# Altium schematic symbol library Kondensator_DIP.SchLib: 1521 symbols (part 1 of 4) (continued)
## K50-6-220U-6.3V-0812 (continued)
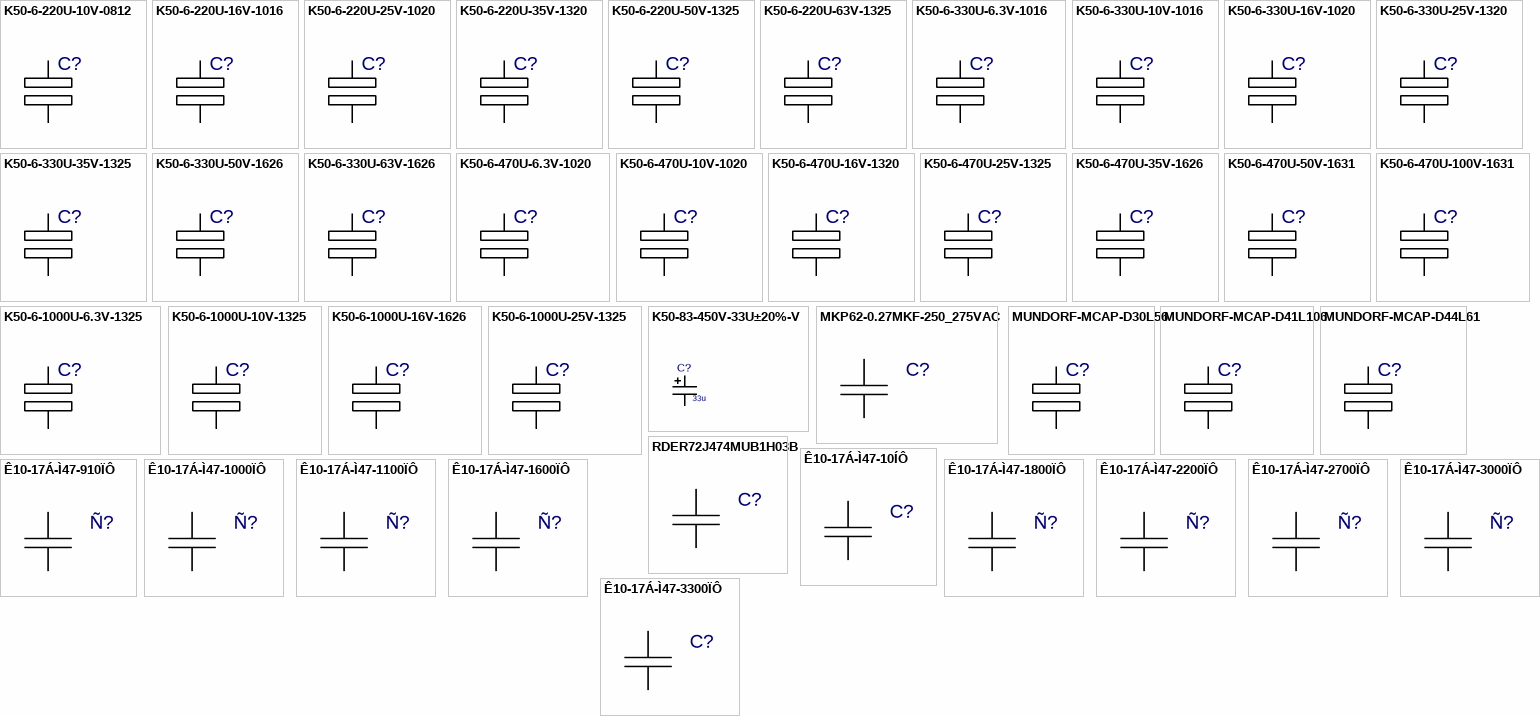
[diagram p7: symbols K50-6-220U-10V-0812 to Ê10-17Á-Ì47-3300ÏÔ]

## K50-6-220U-10V-0812
designator C?  (value not drawn)
Author: pcbdesigner.ru; Value: *
footprint K50-6-0812
pins: 1, 2

## K50-6-220U-16V-1016
designator C?  (value not drawn)
Author: pcbdesigner.ru; Value: *
footprint K50-6-1016
pins: 1, 2

## K50-6-220U-25V-1020
designator C?  (value not drawn)
Author: pcbdesigner.ru; Value: *
footprint K50-6-1020
pins: 1, 2

## K50-6-220U-35V-1320
designator C?  (value not drawn)
Author: pcbdesigner.ru; Value: *
footprint K50-6-1320
pins: 1, 2

## K50-6-220U-50V-1325
designator C?  (value not drawn)
Author: pcbdesigner.ru; Value: *
footprint K50-6-1325
pins: 1, 2

## K50-6-220U-63V-1325
designator C?  (value not drawn)
Author: pcbdesigner.ru; Value: *
footprint K50-6-1325
pins: 1, 2

## K50-6-330U-6.3V-1016
designator C?  (value not drawn)
Author: pcbdesigner.ru; Value: *
footprint K50-6-1016
pins: 1, 2

## K50-6-330U-10V-1016
designator C?  (value not drawn)
Author: pcbdesigner.ru; Value: *
footprint K50-6-1016
pins: 1, 2

## K50-6-330U-16V-1020
designator C?  (value not drawn)
Author: pcbdesigner.ru; Value: *
footprint K50-6-1020
pins: 1, 2

## K50-6-330U-25V-1320
designator C?  (value not drawn)
Author: pcbdesigner.ru; Value: *
footprint K50-6-1320
pins: 1, 2

## K50-6-330U-35V-1325
designator C?  (value not drawn)
Author: pcbdesigner.ru; Value: *
footprint K50-6-1325
pins: 1, 2

## K50-6-330U-50V-1626
designator C?  (value not drawn)
Author: pcbdesigner.ru; Value: *
footprint K50-6-1626
pins: 1, 2

## K50-6-330U-63V-1626
designator C?  (value not drawn)
Author: pcbdesigner.ru; Value: *
footprint K50-6-1626
pins: 1, 2

## K50-6-470U-6.3V-1020
designator C?  (value not drawn)
Author: pcbdesigner.ru; Value: *
footprint K50-6-1020
pins: 1, 2

## K50-6-470U-10V-1020
designator C?  (value not drawn)
Author: pcbdesigner.ru; Value: *
footprint K50-6-1020
pins: 1, 2

## K50-6-470U-16V-1320
designator C?  (value not drawn)
Author: pcbdesigner.ru; Value: *
footprint K50-6-1320
pins: 1, 2

## K50-6-470U-25V-1325
designator C?  (value not drawn)
Author: pcbdesigner.ru; Value: *
footprint K50-6-1325
pins: 1, 2

## K50-6-470U-35V-1626
designator C?  (value not drawn)
Author: pcbdesigner.ru; Value: *
footprint K50-6-1626
pins: 1, 2

## K50-6-470U-50V-1631
designator C?  (value not drawn)
Author: pcbdesigner.ru; Value: *
footprint K50-6-1631
pins: 1, 2

## K50-6-470U-100V-1631
designator C?  (value not drawn)
Author: pcbdesigner.ru; Value: *
footprint K50-6-1631
pins: 1, 2

## K50-6-1000U-6.3V-1325
designator C?  (value not drawn)
Author: pcbdesigner.ru; Value: *
footprint K50-6-1325
pins: 1, 2

## K50-6-1000U-10V-1325
designator C?  (value not drawn)
Author: pcbdesigner.ru; Value: *
footprint K50-6-1325
pins: 1, 2

## K50-6-1000U-16V-1626
designator C?  (value not drawn)
Author: pcbdesigner.ru; Value: *
footprint K50-6-1626
pins: 1, 2

## K50-6-1000U-25V-1325
designator C?  (value not drawn)
Author: pcbdesigner.ru; Value: *
footprint K50-6-1325
pins: 1, 2

## K50-83-450V-33U±20%-V
designator C?  value 33u  (hidden comment: K50-83-450V-33U±20%-V)
Bi-Polar Capacitor; OriginalName: CAPBP1; ComponentField6: Published 8-Jun-2000
simulation model CAP
footprint K50-83_L33D18P7_5_HOR
footprint K50-83_L33D18P7_5_Primary
pins: 1, 2
2 alternate drawings of the same symbol

## MKP62-0.27MKF-250_275VAC
designator C?  (value not drawn)
Value: *
footprint MKP62 250_275 VAC
pins: 1, 2

## MUNDORF-MCAP-D30L56
designator C?  (value not drawn)
Author: pcbdesigner.ru; Value: *
footprint MUNDORF-MCAP-D30L56
pins: 1, 2

## MUNDORF-MCAP-D41L106
designator C?  (value not drawn)
Author: pcbdesigner.ru; Value: *
footprint MUNDORF-MCAP-D41L106
pins: 1, 2

## MUNDORF-MCAP-D44L61
designator C?  (value not drawn)
Author: pcbdesigner.ru; Value: *
footprint MUNDORF-MCAP-D44L61
pins: 1, 2

## RDER72J474MUB1H03B
designator C?  (value not drawn)
Value: *
footprint 1210_DIP
pins: 1, 2

## Ê10-17Á-Ì47-10ÍÔ
designator C?  (value not drawn)
Value: *
footprint Ê10-17Á-4
pins: 1, 2

## Ê10-17Á-Ì47-910ÏÔ
designator Ñ?  (value not drawn)
Value: *
footprint K10-17Á-2
pins: 1, 2

## Ê10-17Á-Ì47-1000ÏÔ
designator Ñ?  (value not drawn)
Value: *
footprint K10-17Á-2
pins: 1, 2

## Ê10-17Á-Ì47-1100ÏÔ
designator Ñ?  (value not drawn)
Value: *
footprint K10-17Á-2
pins: 1, 2

## Ê10-17Á-Ì47-1600ÏÔ
designator Ñ?  (value not drawn)
Value: *
footprint K10-17Á-2
pins: 1, 2

## Ê10-17Á-Ì47-1800ÏÔ
designator Ñ?  (value not drawn)
Value: *
footprint K10-17Á-2
pins: 1, 2

## Ê10-17Á-Ì47-2200ÏÔ
designator Ñ?  (value not drawn)
Value: *
footprint K10-17Á-2
pins: 1, 2

## Ê10-17Á-Ì47-2700ÏÔ
designator Ñ?  (value not drawn)
Value: *
footprint K10-17Á-2
pins: 1, 2

## Ê10-17Á-Ì47-3000ÏÔ
designator Ñ?  (value not drawn)
Value: *
footprint K10-17Á-2
pins: 1, 2

## Ê10-17Á-Ì47-3300ÏÔ
designator C?  (value not drawn)
Value: *
footprint Ê10-17Á-4
pins: 1, 2

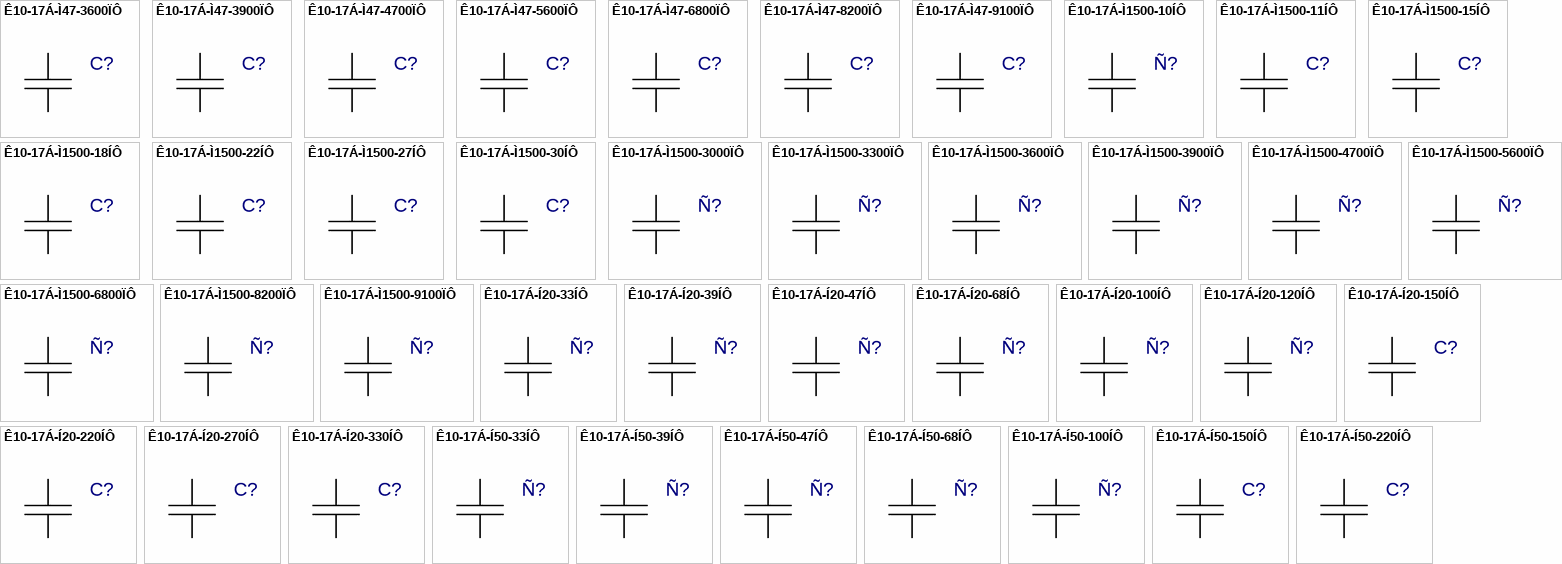
[diagram p8: symbols Ê10-17Á-Ì47-3600ÏÔ to Ê10-17Á-Í50-220ÍÔ]

## Ê10-17Á-Ì47-3600ÏÔ
designator C?  (value not drawn)
Value: *
footprint Ê10-17Á-4
pins: 1, 2

## Ê10-17Á-Ì47-3900ÏÔ
designator C?  (value not drawn)
Value: *
footprint Ê10-17Á-4
pins: 1, 2

## Ê10-17Á-Ì47-4700ÏÔ
designator C?  (value not drawn)
Value: *
footprint Ê10-17Á-4
pins: 1, 2

## Ê10-17Á-Ì47-5600ÏÔ
designator C?  (value not drawn)
Value: *
footprint Ê10-17Á-4
pins: 1, 2

## Ê10-17Á-Ì47-6800ÏÔ
designator C?  (value not drawn)
Value: *
footprint Ê10-17Á-4
pins: 1, 2

## Ê10-17Á-Ì47-8200ÏÔ
designator C?  (value not drawn)
Value: *
footprint Ê10-17Á-4
pins: 1, 2

## Ê10-17Á-Ì47-9100ÏÔ
designator C?  (value not drawn)
Value: *
footprint Ê10-17Á-4
pins: 1, 2

## Ê10-17Á-Ì1500-10ÍÔ
designator Ñ?  (value not drawn)
Value: *
footprint K10-17Á-2
pins: 1, 2

## Ê10-17Á-Ì1500-11ÍÔ
designator C?  (value not drawn)
Value: *
footprint Ê10-17Á-4
pins: 1, 2

## Ê10-17Á-Ì1500-15ÍÔ
designator C?  (value not drawn)
Value: *
footprint Ê10-17Á-4
pins: 1, 2

## Ê10-17Á-Ì1500-18ÍÔ
designator C?  (value not drawn)
Value: *
footprint Ê10-17Á-4
pins: 1, 2

## Ê10-17Á-Ì1500-22ÍÔ
designator C?  (value not drawn)
Value: *
footprint Ê10-17Á-4
pins: 1, 2

## Ê10-17Á-Ì1500-27ÍÔ
designator C?  (value not drawn)
Value: *
footprint Ê10-17Á-4
pins: 1, 2

## Ê10-17Á-Ì1500-30ÍÔ
designator C?  (value not drawn)
Value: *
footprint Ê10-17Á-4
pins: 1, 2

## Ê10-17Á-Ì1500-3000ÏÔ
designator Ñ?  (value not drawn)
Value: *
footprint K10-17Á-2
pins: 1, 2

## Ê10-17Á-Ì1500-3300ÏÔ
designator Ñ?  (value not drawn)
Value: *
footprint K10-17Á-2
pins: 1, 2

## Ê10-17Á-Ì1500-3600ÏÔ
designator Ñ?  (value not drawn)
Value: *
footprint K10-17Á-2
pins: 1, 2

## Ê10-17Á-Ì1500-3900ÏÔ
designator Ñ?  (value not drawn)
Value: *
footprint K10-17Á-2
pins: 1, 2

## Ê10-17Á-Ì1500-4700ÏÔ
designator Ñ?  (value not drawn)
Value: *
footprint K10-17Á-2
pins: 1, 2

## Ê10-17Á-Ì1500-5600ÏÔ
designator Ñ?  (value not drawn)
Value: *
footprint K10-17Á-2
pins: 1, 2

## Ê10-17Á-Ì1500-6800ÏÔ
designator Ñ?  (value not drawn)
Value: *
footprint K10-17Á-2
pins: 1, 2

## Ê10-17Á-Ì1500-8200ÏÔ
designator Ñ?  (value not drawn)
Value: *
footprint K10-17Á-2
pins: 1, 2

## Ê10-17Á-Ì1500-9100ÏÔ
designator Ñ?  (value not drawn)
Value: *
footprint K10-17Á-2
pins: 1, 2

## Ê10-17Á-Í20-33ÍÔ
designator Ñ?  (value not drawn)
Value: *
footprint K10-17Á-2
pins: 1, 2

## Ê10-17Á-Í20-39ÍÔ
designator Ñ?  (value not drawn)
Value: *
footprint K10-17Á-2
pins: 1, 2

## Ê10-17Á-Í20-47ÍÔ
designator Ñ?  (value not drawn)
Value: *
footprint K10-17Á-2
pins: 1, 2

## Ê10-17Á-Í20-68ÍÔ
designator Ñ?  (value not drawn)
Value: *
footprint K10-17Á-2
pins: 1, 2

## Ê10-17Á-Í20-100ÍÔ
designator Ñ?  (value not drawn)
Value: *
footprint K10-17Á-2
pins: 1, 2

## Ê10-17Á-Í20-120ÍÔ
designator Ñ?  (value not drawn)
Value: *
footprint K10-17Á-2
pins: 1, 2

## Ê10-17Á-Í20-150ÍÔ
designator C?  (value not drawn)
Value: *
footprint Ê10-17Á-4
pins: 1, 2

## Ê10-17Á-Í20-220ÍÔ
designator C?  (value not drawn)
Value: *
footprint Ê10-17Á-4
pins: 1, 2

## Ê10-17Á-Í20-270ÍÔ
designator C?  (value not drawn)
Value: *
footprint Ê10-17Á-4
pins: 1, 2

## Ê10-17Á-Í20-330ÍÔ
designator C?  (value not drawn)
Value: *
footprint Ê10-17Á-4
pins: 1, 2

## Ê10-17Á-Í50-33ÍÔ
designator Ñ?  (value not drawn)
Value: *
footprint K10-17Á-2
pins: 1, 2

## Ê10-17Á-Í50-39ÍÔ
designator Ñ?  (value not drawn)
Value: *
footprint K10-17Á-2
pins: 1, 2

## Ê10-17Á-Í50-47ÍÔ
designator Ñ?  (value not drawn)
Value: *
footprint K10-17Á-2
pins: 1, 2

## Ê10-17Á-Í50-68ÍÔ
designator Ñ?  (value not drawn)
Value: *
footprint K10-17Á-2
pins: 1, 2

## Ê10-17Á-Í50-100ÍÔ
designator Ñ?  (value not drawn)
Value: *
footprint K10-17Á-2
pins: 1, 2

## Ê10-17Á-Í50-150ÍÔ
designator C?  (value not drawn)
Value: *
footprint Ê10-17Á-4
pins: 1, 2

## Ê10-17Á-Í50-220ÍÔ
designator C?  (value not drawn)
Value: *
footprint Ê10-17Á-4
pins: 1, 2

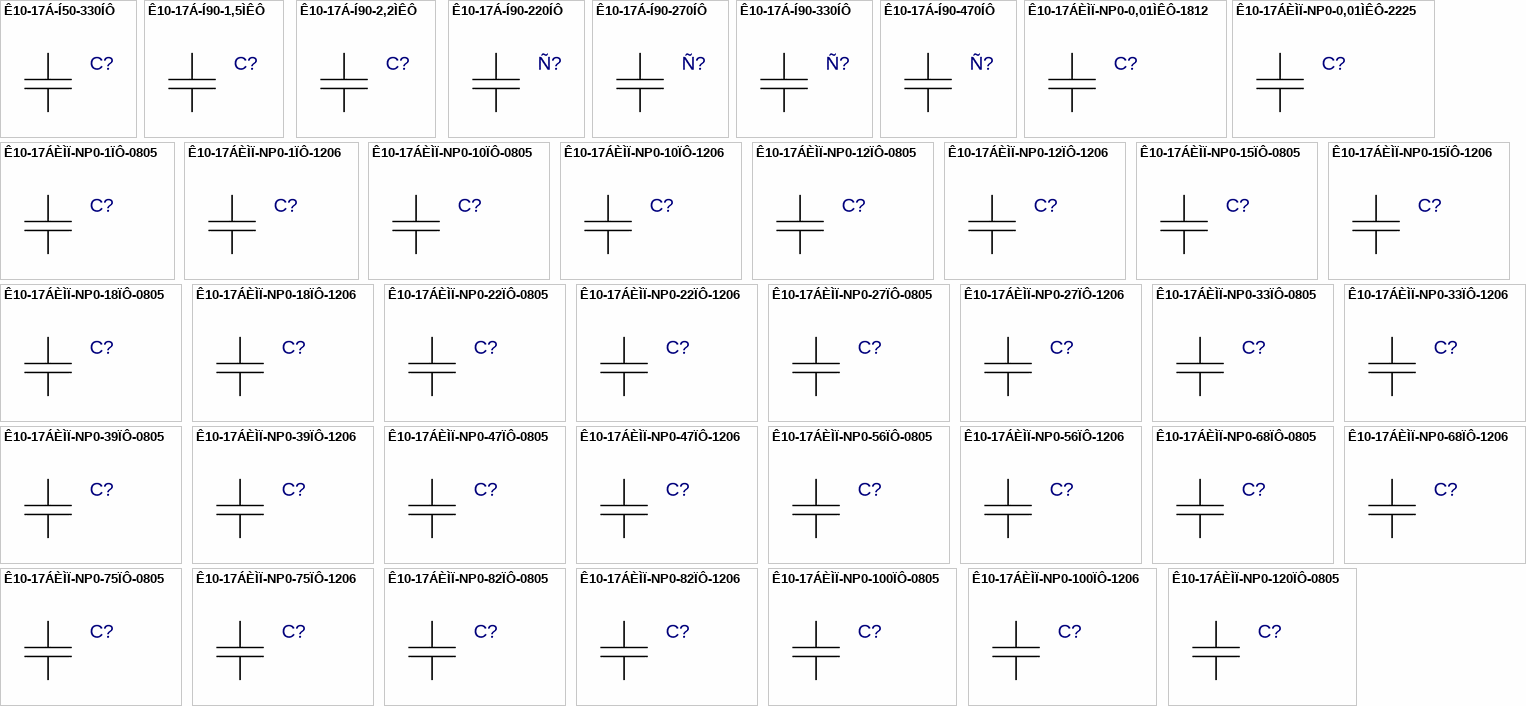
[diagram p9: symbols Ê10-17Á-Í50-330ÍÔ to Ê10-17ÁÈÌÏ-NP0-120ÏÔ-0805]

## Ê10-17Á-Í50-330ÍÔ
designator C?  (value not drawn)
Value: *
footprint Ê10-17Á-4
pins: 1, 2

## Ê10-17Á-Í90-1,5ÌÊÔ
designator C?  (value not drawn)
Value: *
footprint Ê10-17Á-4
pins: 1, 2

## Ê10-17Á-Í90-2,2ÌÊÔ
designator C?  (value not drawn)
Value: *
footprint Ê10-17Á-4
pins: 1, 2

## Ê10-17Á-Í90-220ÍÔ
designator Ñ?  (value not drawn)
Value: *
footprint K10-17Á-2
pins: 1, 2

## Ê10-17Á-Í90-270ÍÔ
designator Ñ?  (value not drawn)
Value: *
footprint K10-17Á-2
pins: 1, 2

## Ê10-17Á-Í90-330ÍÔ
designator Ñ?  (value not drawn)
Value: *
footprint K10-17Á-2
pins: 1, 2

## Ê10-17Á-Í90-470ÍÔ
designator Ñ?  (value not drawn)
Value: *
footprint K10-17Á-2
pins: 1, 2

## Ê10-17ÁÈÌÏ-NP0-0,01ÌÊÔ-1812
designator C?  (value not drawn)
Value: *
footprint 1812_DIP
pins: 1, 2

## Ê10-17ÁÈÌÏ-NP0-0,01ÌÊÔ-2225
designator C?  (value not drawn)
Value: *
footprint 2225_DIP
pins: 1, 2

## Ê10-17ÁÈÌÏ-NP0-1ÏÔ-0805
designator C?  (value not drawn)
Value: *
footprint 0805_DIP
pins: 1, 2

## Ê10-17ÁÈÌÏ-NP0-1ÏÔ-1206
designator C?  (value not drawn)
Value: *
footprint 1206_DIP
pins: 1, 2

## Ê10-17ÁÈÌÏ-NP0-10ÏÔ-0805
designator C?  (value not drawn)
Value: *
footprint 0805_DIP
pins: 1, 2

## Ê10-17ÁÈÌÏ-NP0-10ÏÔ-1206
designator C?  (value not drawn)
Value: *
footprint 1206_DIP
pins: 1, 2

## Ê10-17ÁÈÌÏ-NP0-12ÏÔ-0805
designator C?  (value not drawn)
Value: *
footprint 0805_DIP
pins: 1, 2

## Ê10-17ÁÈÌÏ-NP0-12ÏÔ-1206
designator C?  (value not drawn)
Value: *
footprint 1206_DIP
pins: 1, 2

## Ê10-17ÁÈÌÏ-NP0-15ÏÔ-0805
designator C?  (value not drawn)
Value: *
footprint 0805_DIP
pins: 1, 2

## Ê10-17ÁÈÌÏ-NP0-15ÏÔ-1206
designator C?  (value not drawn)
Value: *
footprint 1206_DIP
pins: 1, 2

## Ê10-17ÁÈÌÏ-NP0-18ÏÔ-0805
designator C?  (value not drawn)
Value: *
footprint 0805_DIP
pins: 1, 2

## Ê10-17ÁÈÌÏ-NP0-18ÏÔ-1206
designator C?  (value not drawn)
Value: *
footprint 1206_DIP
pins: 1, 2

## Ê10-17ÁÈÌÏ-NP0-22ÏÔ-0805
designator C?  (value not drawn)
Value: *
footprint 0805_DIP
pins: 1, 2

## Ê10-17ÁÈÌÏ-NP0-22ÏÔ-1206
designator C?  (value not drawn)
Value: *
footprint 1206_DIP
pins: 1, 2

## Ê10-17ÁÈÌÏ-NP0-27ÏÔ-0805
designator C?  (value not drawn)
Value: *
footprint 0805_DIP
pins: 1, 2

## Ê10-17ÁÈÌÏ-NP0-27ÏÔ-1206
designator C?  (value not drawn)
Value: *
footprint 1206_DIP
pins: 1, 2

## Ê10-17ÁÈÌÏ-NP0-33ÏÔ-0805
designator C?  (value not drawn)
Value: *
footprint 0805_DIP
pins: 1, 2

## Ê10-17ÁÈÌÏ-NP0-33ÏÔ-1206
designator C?  (value not drawn)
Value: *
footprint 1206_DIP
pins: 1, 2

## Ê10-17ÁÈÌÏ-NP0-39ÏÔ-0805
designator C?  (value not drawn)
Value: *
footprint 0805_DIP
pins: 1, 2

## Ê10-17ÁÈÌÏ-NP0-39ÏÔ-1206
designator C?  (value not drawn)
Value: *
footprint 1206_DIP
pins: 1, 2

## Ê10-17ÁÈÌÏ-NP0-47ÏÔ-0805
designator C?  (value not drawn)
Value: *
footprint 0805_DIP
pins: 1, 2

## Ê10-17ÁÈÌÏ-NP0-47ÏÔ-1206
designator C?  (value not drawn)
Value: *
footprint 1206_DIP
pins: 1, 2

## Ê10-17ÁÈÌÏ-NP0-56ÏÔ-0805
designator C?  (value not drawn)
Value: *
footprint 0805_DIP
pins: 1, 2

## Ê10-17ÁÈÌÏ-NP0-56ÏÔ-1206
designator C?  (value not drawn)
Value: *
footprint 1206_DIP
pins: 1, 2

## Ê10-17ÁÈÌÏ-NP0-68ÏÔ-0805
designator C?  (value not drawn)
Value: *
footprint 0805_DIP
pins: 1, 2

## Ê10-17ÁÈÌÏ-NP0-68ÏÔ-1206
designator C?  (value not drawn)
Value: *
footprint 1206_DIP
pins: 1, 2

## Ê10-17ÁÈÌÏ-NP0-75ÏÔ-0805
designator C?  (value not drawn)
Value: *
footprint 0805_DIP
pins: 1, 2

## Ê10-17ÁÈÌÏ-NP0-75ÏÔ-1206
designator C?  (value not drawn)
Value: *
footprint 1206_DIP
pins: 1, 2

## Ê10-17ÁÈÌÏ-NP0-82ÏÔ-0805
designator C?  (value not drawn)
Value: *
footprint 0805_DIP
pins: 1, 2

## Ê10-17ÁÈÌÏ-NP0-82ÏÔ-1206
designator C?  (value not drawn)
Value: *
footprint 1206_DIP
pins: 1, 2

## Ê10-17ÁÈÌÏ-NP0-100ÏÔ-0805
designator C?  (value not drawn)
Value: *
footprint 0805_DIP
pins: 1, 2

## Ê10-17ÁÈÌÏ-NP0-100ÏÔ-1206
designator C?  (value not drawn)
Value: *
footprint 1206_DIP
pins: 1, 2

## Ê10-17ÁÈÌÏ-NP0-120ÏÔ-0805
designator C?  (value not drawn)
Value: *
footprint 0805_DIP
pins: 1, 2

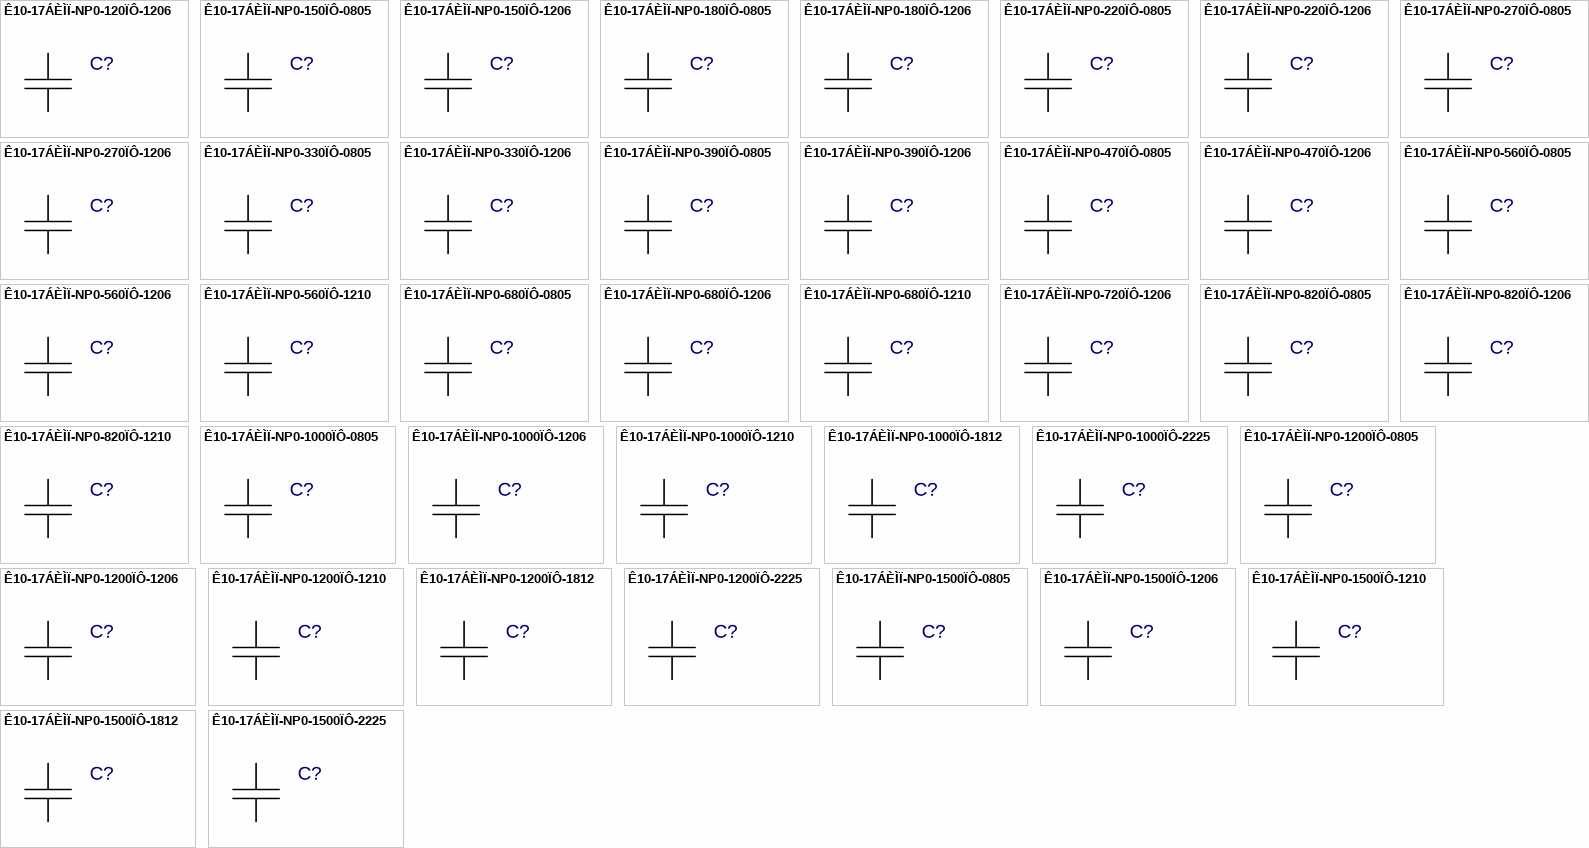
[diagram p10: symbols Ê10-17ÁÈÌÏ-NP0-120ÏÔ-1206 to Ê10-17ÁÈÌÏ-NP0-1500ÏÔ-2225]

## Ê10-17ÁÈÌÏ-NP0-120ÏÔ-1206
designator C?  (value not drawn)
Value: *
footprint 1206_DIP
pins: 1, 2

## Ê10-17ÁÈÌÏ-NP0-150ÏÔ-0805
designator C?  (value not drawn)
Value: *
footprint 0805_DIP
pins: 1, 2

## Ê10-17ÁÈÌÏ-NP0-150ÏÔ-1206
designator C?  (value not drawn)
Value: *
footprint 1206_DIP
pins: 1, 2

## Ê10-17ÁÈÌÏ-NP0-180ÏÔ-0805
designator C?  (value not drawn)
Value: *
footprint 0805_DIP
pins: 1, 2

## Ê10-17ÁÈÌÏ-NP0-180ÏÔ-1206
designator C?  (value not drawn)
Value: *
footprint 1206_DIP
pins: 1, 2

## Ê10-17ÁÈÌÏ-NP0-220ÏÔ-0805
designator C?  (value not drawn)
Value: *
footprint 0805_DIP
pins: 1, 2

## Ê10-17ÁÈÌÏ-NP0-220ÏÔ-1206
designator C?  (value not drawn)
Value: *
footprint 1206_DIP
pins: 1, 2

## Ê10-17ÁÈÌÏ-NP0-270ÏÔ-0805
designator C?  (value not drawn)
Value: *
footprint 0805_DIP
pins: 1, 2

## Ê10-17ÁÈÌÏ-NP0-270ÏÔ-1206
designator C?  (value not drawn)
Value: *
footprint 1206_DIP
pins: 1, 2

## Ê10-17ÁÈÌÏ-NP0-330ÏÔ-0805
designator C?  (value not drawn)
Value: *
footprint 0805_DIP
pins: 1, 2

## Ê10-17ÁÈÌÏ-NP0-330ÏÔ-1206
designator C?  (value not drawn)
Value: *
footprint 1206_DIP
pins: 1, 2

## Ê10-17ÁÈÌÏ-NP0-390ÏÔ-0805
designator C?  (value not drawn)
Value: *
footprint 0805_DIP
pins: 1, 2

## Ê10-17ÁÈÌÏ-NP0-390ÏÔ-1206
designator C?  (value not drawn)
Value: *
footprint 1206_DIP
pins: 1, 2

## Ê10-17ÁÈÌÏ-NP0-470ÏÔ-0805
designator C?  (value not drawn)
Value: *
footprint 0805_DIP
pins: 1, 2

## Ê10-17ÁÈÌÏ-NP0-470ÏÔ-1206
designator C?  (value not drawn)
Value: *
footprint 1206_DIP
pins: 1, 2

## Ê10-17ÁÈÌÏ-NP0-560ÏÔ-0805
designator C?  (value not drawn)
Value: *
footprint 0805_DIP
pins: 1, 2

## Ê10-17ÁÈÌÏ-NP0-560ÏÔ-1206
designator C?  (value not drawn)
Value: *
footprint 1206_DIP
pins: 1, 2

## Ê10-17ÁÈÌÏ-NP0-560ÏÔ-1210
designator C?  (value not drawn)
Value: *
footprint 1210_DIP
pins: 1, 2

## Ê10-17ÁÈÌÏ-NP0-680ÏÔ-0805
designator C?  (value not drawn)
Value: *
footprint 0805_DIP
pins: 1, 2

## Ê10-17ÁÈÌÏ-NP0-680ÏÔ-1206
designator C?  (value not drawn)
Value: *
footprint 1206_DIP
pins: 1, 2

## Ê10-17ÁÈÌÏ-NP0-680ÏÔ-1210
designator C?  (value not drawn)
Value: *
footprint 1210_DIP
pins: 1, 2

## Ê10-17ÁÈÌÏ-NP0-720ÏÔ-1206
designator C?  (value not drawn)
Value: *
footprint 1206_DIP
pins: 1, 2

## Ê10-17ÁÈÌÏ-NP0-820ÏÔ-0805
designator C?  (value not drawn)
Value: *
footprint 0805_DIP
pins: 1, 2

## Ê10-17ÁÈÌÏ-NP0-820ÏÔ-1206
designator C?  (value not drawn)
Value: *
footprint 1206_DIP
pins: 1, 2

## Ê10-17ÁÈÌÏ-NP0-820ÏÔ-1210
designator C?  (value not drawn)
Value: *
footprint 1210_DIP
pins: 1, 2

## Ê10-17ÁÈÌÏ-NP0-1000ÏÔ-0805
designator C?  (value not drawn)
Value: *
footprint 0805_DIP
pins: 1, 2

## Ê10-17ÁÈÌÏ-NP0-1000ÏÔ-1206
designator C?  (value not drawn)
Value: *
footprint 1206_DIP
pins: 1, 2

## Ê10-17ÁÈÌÏ-NP0-1000ÏÔ-1210
designator C?  (value not drawn)
Value: *
footprint 1210_DIP
pins: 1, 2

## Ê10-17ÁÈÌÏ-NP0-1000ÏÔ-1812
designator C?  (value not drawn)
Value: *
footprint 1812_DIP
pins: 1, 2

## Ê10-17ÁÈÌÏ-NP0-1000ÏÔ-2225
designator C?  (value not drawn)
Value: *
footprint 2225_DIP
pins: 1, 2

## Ê10-17ÁÈÌÏ-NP0-1200ÏÔ-0805
designator C?  (value not drawn)
Value: *
footprint 0805_DIP
pins: 1, 2

## Ê10-17ÁÈÌÏ-NP0-1200ÏÔ-1206
designator C?  (value not drawn)
Value: *
footprint 1206_DIP
pins: 1, 2

## Ê10-17ÁÈÌÏ-NP0-1200ÏÔ-1210
designator C?  (value not drawn)
Value: *
footprint 1210_DIP
pins: 1, 2

## Ê10-17ÁÈÌÏ-NP0-1200ÏÔ-1812
designator C?  (value not drawn)
Value: *
footprint 1812_DIP
pins: 1, 2

## Ê10-17ÁÈÌÏ-NP0-1200ÏÔ-2225
designator C?  (value not drawn)
Value: *
footprint 2225_DIP
pins: 1, 2

## Ê10-17ÁÈÌÏ-NP0-1500ÏÔ-0805
designator C?  (value not drawn)
Value: *
footprint 0805_DIP
pins: 1, 2

## Ê10-17ÁÈÌÏ-NP0-1500ÏÔ-1206
designator C?  (value not drawn)
Value: *
footprint 1206_DIP
pins: 1, 2

## Ê10-17ÁÈÌÏ-NP0-1500ÏÔ-1210
designator C?  (value not drawn)
Value: *
footprint 1210_DIP
pins: 1, 2

## Ê10-17ÁÈÌÏ-NP0-1500ÏÔ-1812
designator C?  (value not drawn)
Value: *
footprint 1812_DIP
pins: 1, 2

## Ê10-17ÁÈÌÏ-NP0-1500ÏÔ-2225
designator C?  (value not drawn)
Value: *
footprint 2225_DIP
pins: 1, 2

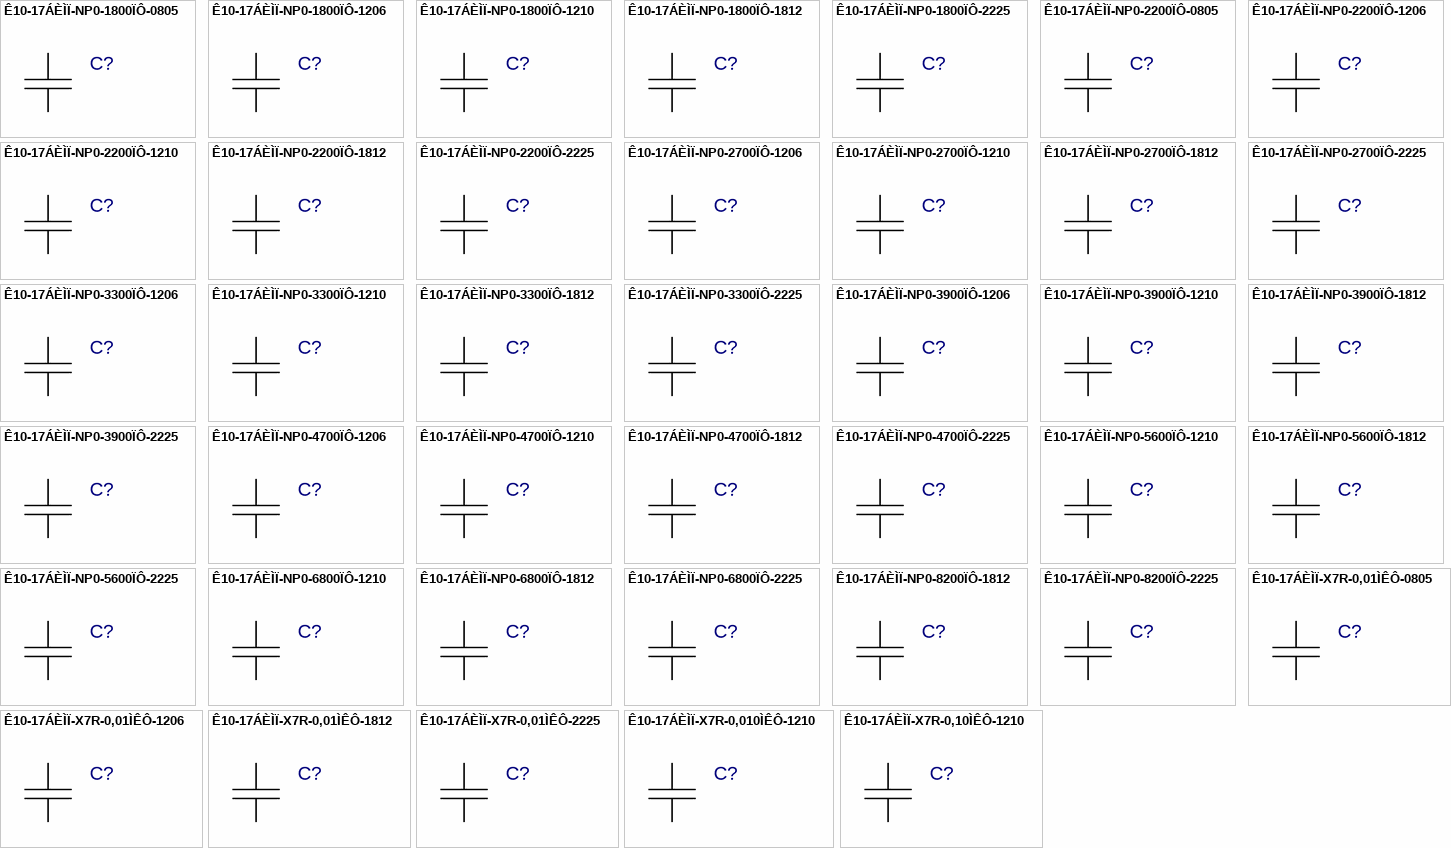
[diagram p11: symbols Ê10-17ÁÈÌÏ-NP0-1800ÏÔ-0805 to Ê10-17ÁÈÌÏ-X7R-0,10ÌÊÔ-1210]

## Ê10-17ÁÈÌÏ-NP0-1800ÏÔ-0805
designator C?  (value not drawn)
Value: *
footprint 0805_DIP
pins: 1, 2

## Ê10-17ÁÈÌÏ-NP0-1800ÏÔ-1206
designator C?  (value not drawn)
Value: *
footprint 1206_DIP
pins: 1, 2

## Ê10-17ÁÈÌÏ-NP0-1800ÏÔ-1210
designator C?  (value not drawn)
Value: *
footprint 1210_DIP
pins: 1, 2

## Ê10-17ÁÈÌÏ-NP0-1800ÏÔ-1812
designator C?  (value not drawn)
Value: *
footprint 1812_DIP
pins: 1, 2

## Ê10-17ÁÈÌÏ-NP0-1800ÏÔ-2225
designator C?  (value not drawn)
Value: *
footprint 2225_DIP
pins: 1, 2

## Ê10-17ÁÈÌÏ-NP0-2200ÏÔ-0805
designator C?  (value not drawn)
Value: *
footprint 0805_DIP
pins: 1, 2

## Ê10-17ÁÈÌÏ-NP0-2200ÏÔ-1206
designator C?  (value not drawn)
Value: *
footprint 1206_DIP
pins: 1, 2

## Ê10-17ÁÈÌÏ-NP0-2200ÏÔ-1210
designator C?  (value not drawn)
Value: *
footprint 1210_DIP
pins: 1, 2

## Ê10-17ÁÈÌÏ-NP0-2200ÏÔ-1812
designator C?  (value not drawn)
Value: *
footprint 1812_DIP
pins: 1, 2

## Ê10-17ÁÈÌÏ-NP0-2200ÏÔ-2225
designator C?  (value not drawn)
Value: *
footprint 2225_DIP
pins: 1, 2

## Ê10-17ÁÈÌÏ-NP0-2700ÏÔ-1206
designator C?  (value not drawn)
Value: *
footprint 1206_DIP
pins: 1, 2

## Ê10-17ÁÈÌÏ-NP0-2700ÏÔ-1210
designator C?  (value not drawn)
Value: *
footprint 1210_DIP
pins: 1, 2

## Ê10-17ÁÈÌÏ-NP0-2700ÏÔ-1812
designator C?  (value not drawn)
Value: *
footprint 1812_DIP
pins: 1, 2

## Ê10-17ÁÈÌÏ-NP0-2700ÏÔ-2225
designator C?  (value not drawn)
Value: *
footprint 2225_DIP
pins: 1, 2

## Ê10-17ÁÈÌÏ-NP0-3300ÏÔ-1206
designator C?  (value not drawn)
Value: *
footprint 1206_DIP
pins: 1, 2

## Ê10-17ÁÈÌÏ-NP0-3300ÏÔ-1210
designator C?  (value not drawn)
Value: *
footprint 1210_DIP
pins: 1, 2

## Ê10-17ÁÈÌÏ-NP0-3300ÏÔ-1812
designator C?  (value not drawn)
Value: *
footprint 1812_DIP
pins: 1, 2

## Ê10-17ÁÈÌÏ-NP0-3300ÏÔ-2225
designator C?  (value not drawn)
Value: *
footprint 2225_DIP
pins: 1, 2

## Ê10-17ÁÈÌÏ-NP0-3900ÏÔ-1206
designator C?  (value not drawn)
Value: *
footprint 1206_DIP
pins: 1, 2

## Ê10-17ÁÈÌÏ-NP0-3900ÏÔ-1210
designator C?  (value not drawn)
Value: *
footprint 1210_DIP
pins: 1, 2

## Ê10-17ÁÈÌÏ-NP0-3900ÏÔ-1812
designator C?  (value not drawn)
Value: *
footprint 1812_DIP
pins: 1, 2

## Ê10-17ÁÈÌÏ-NP0-3900ÏÔ-2225
designator C?  (value not drawn)
Value: *
footprint 2225_DIP
pins: 1, 2

## Ê10-17ÁÈÌÏ-NP0-4700ÏÔ-1206
designator C?  (value not drawn)
Value: *
footprint 1206_DIP
pins: 1, 2

## Ê10-17ÁÈÌÏ-NP0-4700ÏÔ-1210
designator C?  (value not drawn)
Value: *
footprint 1210_DIP
pins: 1, 2

## Ê10-17ÁÈÌÏ-NP0-4700ÏÔ-1812
designator C?  (value not drawn)
Value: *
footprint 1812_DIP
pins: 1, 2

## Ê10-17ÁÈÌÏ-NP0-4700ÏÔ-2225
designator C?  (value not drawn)
Value: *
footprint 2225_DIP
pins: 1, 2

## Ê10-17ÁÈÌÏ-NP0-5600ÏÔ-1210
designator C?  (value not drawn)
Value: *
footprint 1210_DIP
pins: 1, 2

## Ê10-17ÁÈÌÏ-NP0-5600ÏÔ-1812
designator C?  (value not drawn)
Value: *
footprint 1812_DIP
pins: 1, 2

## Ê10-17ÁÈÌÏ-NP0-5600ÏÔ-2225
designator C?  (value not drawn)
Value: *
footprint 2225_DIP
pins: 1, 2

## Ê10-17ÁÈÌÏ-NP0-6800ÏÔ-1210
designator C?  (value not drawn)
Value: *
footprint 1210_DIP
pins: 1, 2

## Ê10-17ÁÈÌÏ-NP0-6800ÏÔ-1812
designator C?  (value not drawn)
Value: *
footprint 1812_DIP
pins: 1, 2

## Ê10-17ÁÈÌÏ-NP0-6800ÏÔ-2225
designator C?  (value not drawn)
Value: *
footprint 2225_DIP
pins: 1, 2

## Ê10-17ÁÈÌÏ-NP0-8200ÏÔ-1812
designator C?  (value not drawn)
Value: *
footprint 1812_DIP
pins: 1, 2

## Ê10-17ÁÈÌÏ-NP0-8200ÏÔ-2225
designator C?  (value not drawn)
Value: *
footprint 2225_DIP
pins: 1, 2

## Ê10-17ÁÈÌÏ-X7R-0,01ÌÊÔ-0805
designator C?  (value not drawn)
Value: *
footprint 0805_DIP
pins: 1, 2

## Ê10-17ÁÈÌÏ-X7R-0,01ÌÊÔ-1206
designator C?  (value not drawn)
Value: *
footprint 1206_DIP
pins: 1, 2

## Ê10-17ÁÈÌÏ-X7R-0,01ÌÊÔ-1812
designator C?  (value not drawn)
Value: *
footprint 1812_DIP
pins: 1, 2

## Ê10-17ÁÈÌÏ-X7R-0,01ÌÊÔ-2225
designator C?  (value not drawn)
Value: *
footprint 2225_DIP
pins: 1, 2

## Ê10-17ÁÈÌÏ-X7R-0,010ÌÊÔ-1210
designator C?  (value not drawn)
Value: *
footprint 1210_DIP
pins: 1, 2

## Ê10-17ÁÈÌÏ-X7R-0,10ÌÊÔ-1210
designator C?  (value not drawn)
Value: *
footprint 1210_DIP
pins: 1, 2

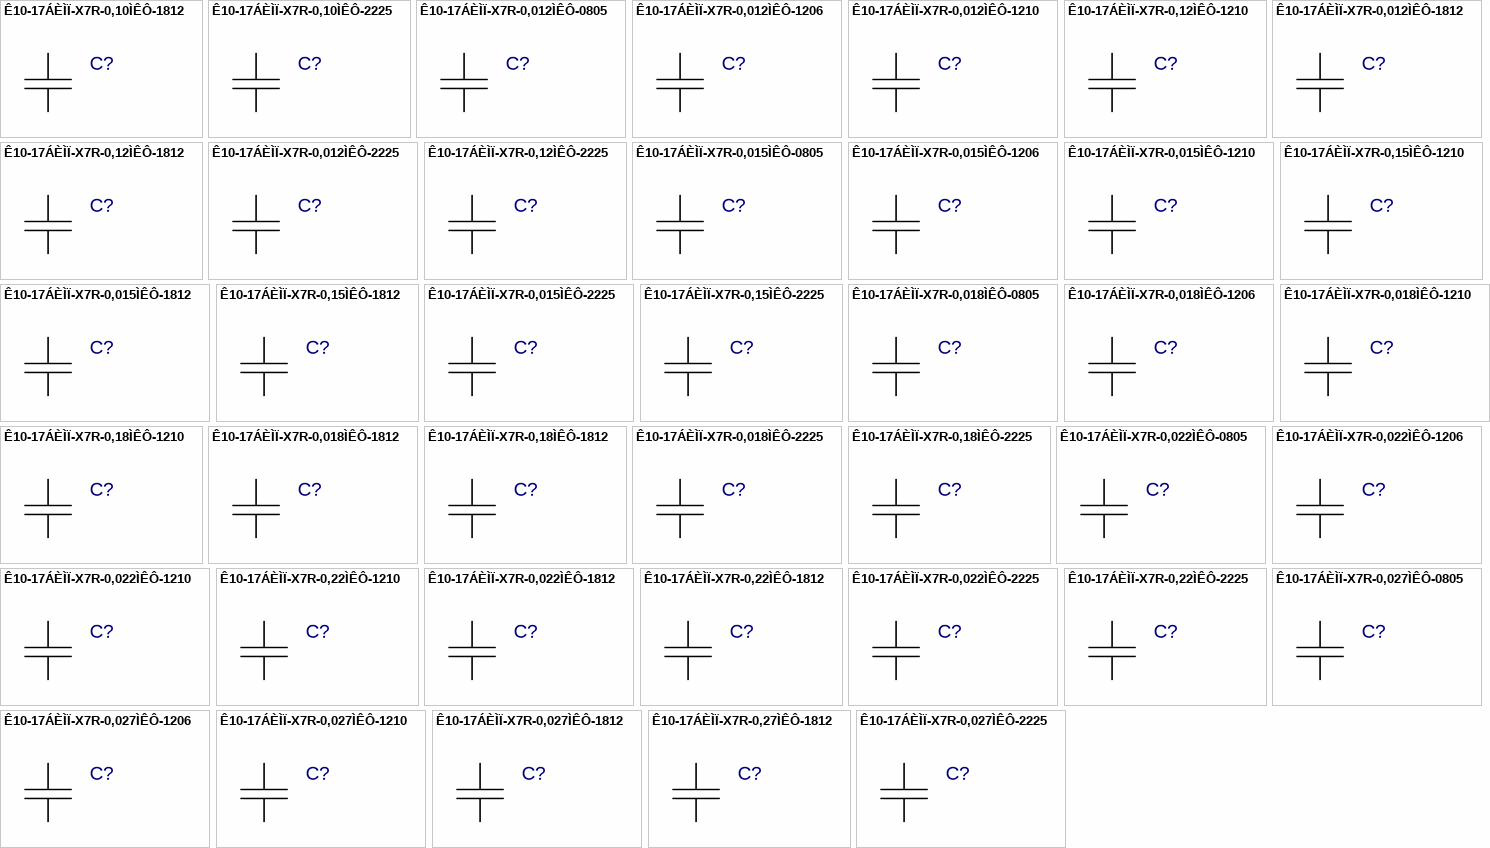
[diagram p12: symbols Ê10-17ÁÈÌÏ-X7R-0,10ÌÊÔ-1812 to Ê10-17ÁÈÌÏ-X7R-0,027ÌÊÔ-2225]

## Ê10-17ÁÈÌÏ-X7R-0,10ÌÊÔ-1812
designator C?  (value not drawn)
Value: *
footprint 1812_DIP
pins: 1, 2

## Ê10-17ÁÈÌÏ-X7R-0,10ÌÊÔ-2225
designator C?  (value not drawn)
Value: *
footprint 2225_DIP
pins: 1, 2

## Ê10-17ÁÈÌÏ-X7R-0,012ÌÊÔ-0805
designator C?  (value not drawn)
Value: *
footprint 0805_DIP
pins: 1, 2

## Ê10-17ÁÈÌÏ-X7R-0,012ÌÊÔ-1206
designator C?  (value not drawn)
Value: *
footprint 1206_DIP
pins: 1, 2

## Ê10-17ÁÈÌÏ-X7R-0,012ÌÊÔ-1210
designator C?  (value not drawn)
Value: *
footprint 1210_DIP
pins: 1, 2

## Ê10-17ÁÈÌÏ-X7R-0,12ÌÊÔ-1210
designator C?  (value not drawn)
Value: *
footprint 1210_DIP
pins: 1, 2

## Ê10-17ÁÈÌÏ-X7R-0,012ÌÊÔ-1812
designator C?  (value not drawn)
Value: *
footprint 1812_DIP
pins: 1, 2

## Ê10-17ÁÈÌÏ-X7R-0,12ÌÊÔ-1812
designator C?  (value not drawn)
Value: *
footprint 1812_DIP
pins: 1, 2

## Ê10-17ÁÈÌÏ-X7R-0,012ÌÊÔ-2225
designator C?  (value not drawn)
Value: *
footprint 2225_DIP
pins: 1, 2

## Ê10-17ÁÈÌÏ-X7R-0,12ÌÊÔ-2225
designator C?  (value not drawn)
Value: *
footprint 2225_DIP
pins: 1, 2

## Ê10-17ÁÈÌÏ-X7R-0,015ÌÊÔ-0805
designator C?  (value not drawn)
Value: *
footprint 0805_DIP
pins: 1, 2

## Ê10-17ÁÈÌÏ-X7R-0,015ÌÊÔ-1206
designator C?  (value not drawn)
Value: *
footprint 1206_DIP
pins: 1, 2

## Ê10-17ÁÈÌÏ-X7R-0,015ÌÊÔ-1210
designator C?  (value not drawn)
Value: *
footprint 1210_DIP
pins: 1, 2

## Ê10-17ÁÈÌÏ-X7R-0,15ÌÊÔ-1210
designator C?  (value not drawn)
Value: *
footprint 1210_DIP
pins: 1, 2

## Ê10-17ÁÈÌÏ-X7R-0,015ÌÊÔ-1812
designator C?  (value not drawn)
Value: *
footprint 1812_DIP
pins: 1, 2

## Ê10-17ÁÈÌÏ-X7R-0,15ÌÊÔ-1812
designator C?  (value not drawn)
Value: *
footprint 1812_DIP
pins: 1, 2

## Ê10-17ÁÈÌÏ-X7R-0,015ÌÊÔ-2225
designator C?  (value not drawn)
Value: *
footprint 2225_DIP
pins: 1, 2

## Ê10-17ÁÈÌÏ-X7R-0,15ÌÊÔ-2225
designator C?  (value not drawn)
Value: *
footprint 2225_DIP
pins: 1, 2

## Ê10-17ÁÈÌÏ-X7R-0,018ÌÊÔ-0805
designator C?  (value not drawn)
Value: *
footprint 0805_DIP
pins: 1, 2

## Ê10-17ÁÈÌÏ-X7R-0,018ÌÊÔ-1206
designator C?  (value not drawn)
Value: *
footprint 1206_DIP
pins: 1, 2

## Ê10-17ÁÈÌÏ-X7R-0,018ÌÊÔ-1210
designator C?  (value not drawn)
Value: *
footprint 1210_DIP
pins: 1, 2

## Ê10-17ÁÈÌÏ-X7R-0,18ÌÊÔ-1210
designator C?  (value not drawn)
Value: *
footprint 1210_DIP
pins: 1, 2

## Ê10-17ÁÈÌÏ-X7R-0,018ÌÊÔ-1812
designator C?  (value not drawn)
Value: *
footprint 1812_DIP
pins: 1, 2

## Ê10-17ÁÈÌÏ-X7R-0,18ÌÊÔ-1812
designator C?  (value not drawn)
Value: *
footprint 1812_DIP
pins: 1, 2

## Ê10-17ÁÈÌÏ-X7R-0,018ÌÊÔ-2225
designator C?  (value not drawn)
Value: *
footprint 2225_DIP
pins: 1, 2

## Ê10-17ÁÈÌÏ-X7R-0,18ÌÊÔ-2225
designator C?  (value not drawn)
Value: *
footprint 2225_DIP
pins: 1, 2

## Ê10-17ÁÈÌÏ-X7R-0,022ÌÊÔ-0805
designator C?  (value not drawn)
Value: *
footprint 0805_DIP
pins: 1, 2

## Ê10-17ÁÈÌÏ-X7R-0,022ÌÊÔ-1206
designator C?  (value not drawn)
Value: *
footprint 1206_DIP
pins: 1, 2

## Ê10-17ÁÈÌÏ-X7R-0,022ÌÊÔ-1210
designator C?  (value not drawn)
Value: *
footprint 1210_DIP
pins: 1, 2

## Ê10-17ÁÈÌÏ-X7R-0,22ÌÊÔ-1210
designator C?  (value not drawn)
Value: *
footprint 1210_DIP
pins: 1, 2

## Ê10-17ÁÈÌÏ-X7R-0,022ÌÊÔ-1812
designator C?  (value not drawn)
Value: *
footprint 1812_DIP
pins: 1, 2

## Ê10-17ÁÈÌÏ-X7R-0,22ÌÊÔ-1812
designator C?  (value not drawn)
Value: *
footprint 1812_DIP
pins: 1, 2

## Ê10-17ÁÈÌÏ-X7R-0,022ÌÊÔ-2225
designator C?  (value not drawn)
Value: *
footprint 2225_DIP
pins: 1, 2

## Ê10-17ÁÈÌÏ-X7R-0,22ÌÊÔ-2225
designator C?  (value not drawn)
Value: *
footprint 2225_DIP
pins: 1, 2

## Ê10-17ÁÈÌÏ-X7R-0,027ÌÊÔ-0805
designator C?  (value not drawn)
Value: *
footprint 0805_DIP
pins: 1, 2

## Ê10-17ÁÈÌÏ-X7R-0,027ÌÊÔ-1206
designator C?  (value not drawn)
Value: *
footprint 1206_DIP
pins: 1, 2

## Ê10-17ÁÈÌÏ-X7R-0,027ÌÊÔ-1210
designator C?  (value not drawn)
Value: *
footprint 1210_DIP
pins: 1, 2

## Ê10-17ÁÈÌÏ-X7R-0,027ÌÊÔ-1812
designator C?  (value not drawn)
Value: *
footprint 1812_DIP
pins: 1, 2

## Ê10-17ÁÈÌÏ-X7R-0,27ÌÊÔ-1812
designator C?  (value not drawn)
Value: *
footprint 1812_DIP
pins: 1, 2

## Ê10-17ÁÈÌÏ-X7R-0,027ÌÊÔ-2225
designator C?  (value not drawn)
Value: *
footprint 2225_DIP
pins: 1, 2

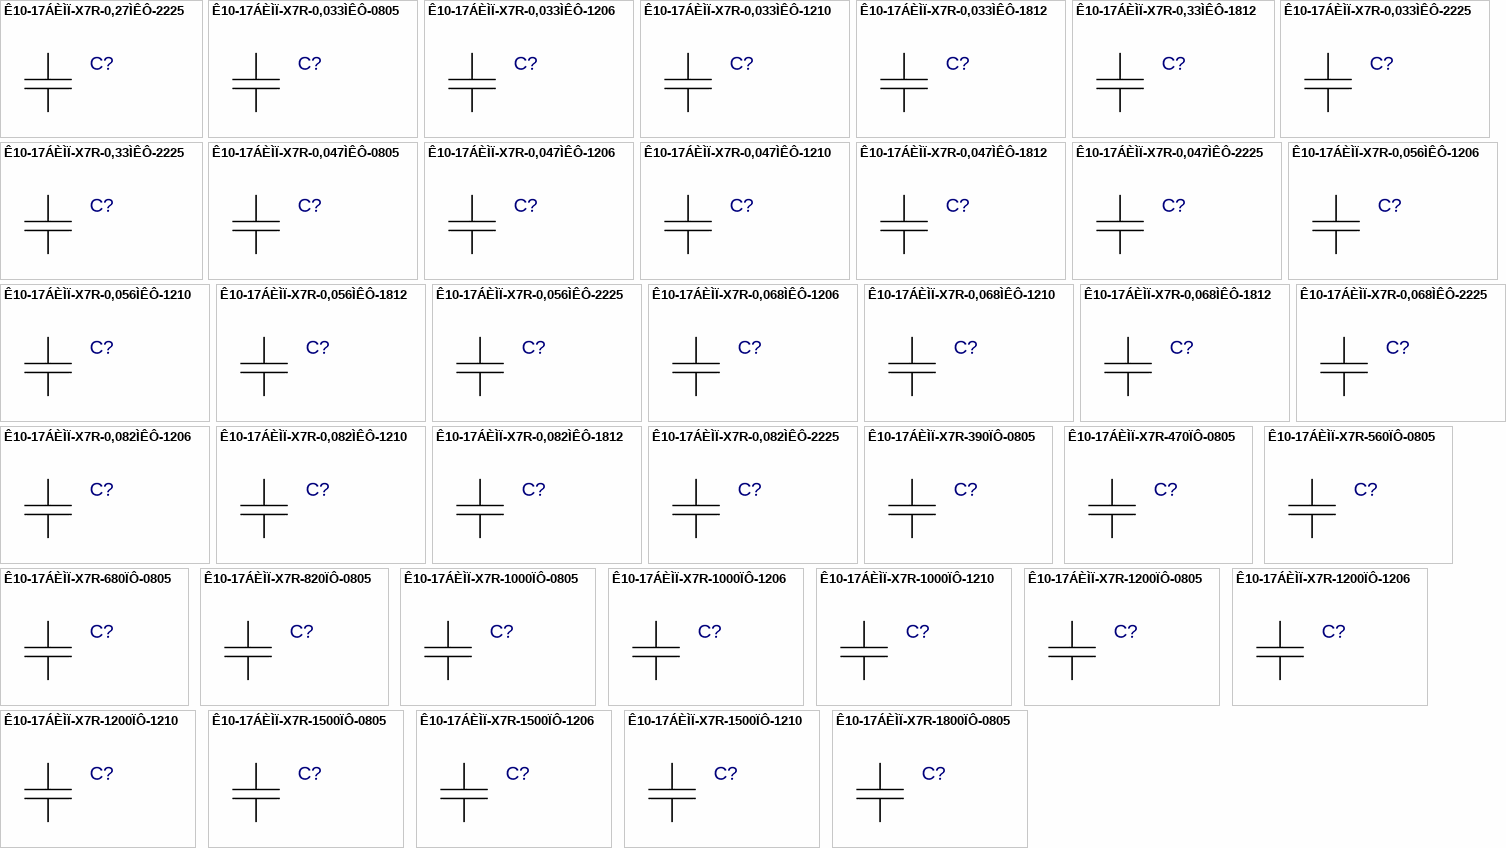
[diagram p13: symbols Ê10-17ÁÈÌÏ-X7R-0,27ÌÊÔ-2225 to Ê10-17ÁÈÌÏ-X7R-1800ÏÔ-0805]

## Ê10-17ÁÈÌÏ-X7R-0,27ÌÊÔ-2225
designator C?  (value not drawn)
Value: *
footprint 2225_DIP
pins: 1, 2

## Ê10-17ÁÈÌÏ-X7R-0,033ÌÊÔ-0805
designator C?  (value not drawn)
Value: *
footprint 0805_DIP
pins: 1, 2

## Ê10-17ÁÈÌÏ-X7R-0,033ÌÊÔ-1206
designator C?  (value not drawn)
Value: *
footprint 1206_DIP
pins: 1, 2

## Ê10-17ÁÈÌÏ-X7R-0,033ÌÊÔ-1210
designator C?  (value not drawn)
Value: *
footprint 1210_DIP
pins: 1, 2

## Ê10-17ÁÈÌÏ-X7R-0,033ÌÊÔ-1812
designator C?  (value not drawn)
Value: *
footprint 1812_DIP
pins: 1, 2

## Ê10-17ÁÈÌÏ-X7R-0,33ÌÊÔ-1812
designator C?  (value not drawn)
Value: *
footprint 1812_DIP
pins: 1, 2

## Ê10-17ÁÈÌÏ-X7R-0,033ÌÊÔ-2225
designator C?  (value not drawn)
Value: *
footprint 2225_DIP
pins: 1, 2

## Ê10-17ÁÈÌÏ-X7R-0,33ÌÊÔ-2225
designator C?  (value not drawn)
Value: *
footprint 2225_DIP
pins: 1, 2

## Ê10-17ÁÈÌÏ-X7R-0,047ÌÊÔ-0805
designator C?  (value not drawn)
Value: *
footprint 0805_DIP
pins: 1, 2

## Ê10-17ÁÈÌÏ-X7R-0,047ÌÊÔ-1206
designator C?  (value not drawn)
Value: *
footprint 1206_DIP
pins: 1, 2

## Ê10-17ÁÈÌÏ-X7R-0,047ÌÊÔ-1210
designator C?  (value not drawn)
Value: *
footprint 1210_DIP
pins: 1, 2

## Ê10-17ÁÈÌÏ-X7R-0,047ÌÊÔ-1812
designator C?  (value not drawn)
Value: *
footprint 1812_DIP
pins: 1, 2

## Ê10-17ÁÈÌÏ-X7R-0,047ÌÊÔ-2225
designator C?  (value not drawn)
Value: *
footprint 2225_DIP
pins: 1, 2